# Altium footprint library CPD.PcbLib: 58 footprints (part 1 of 4)
Each footprint in its own frame and in the unit in brackets; x right, y up, seen from the top. Pads: shape width x height; smd on the part's side, far side on the other; paste and mask are expansions set on the pad; w line width, h text height; cw(c..) or ccw(c..) is an arc to the next point about the centre after c.
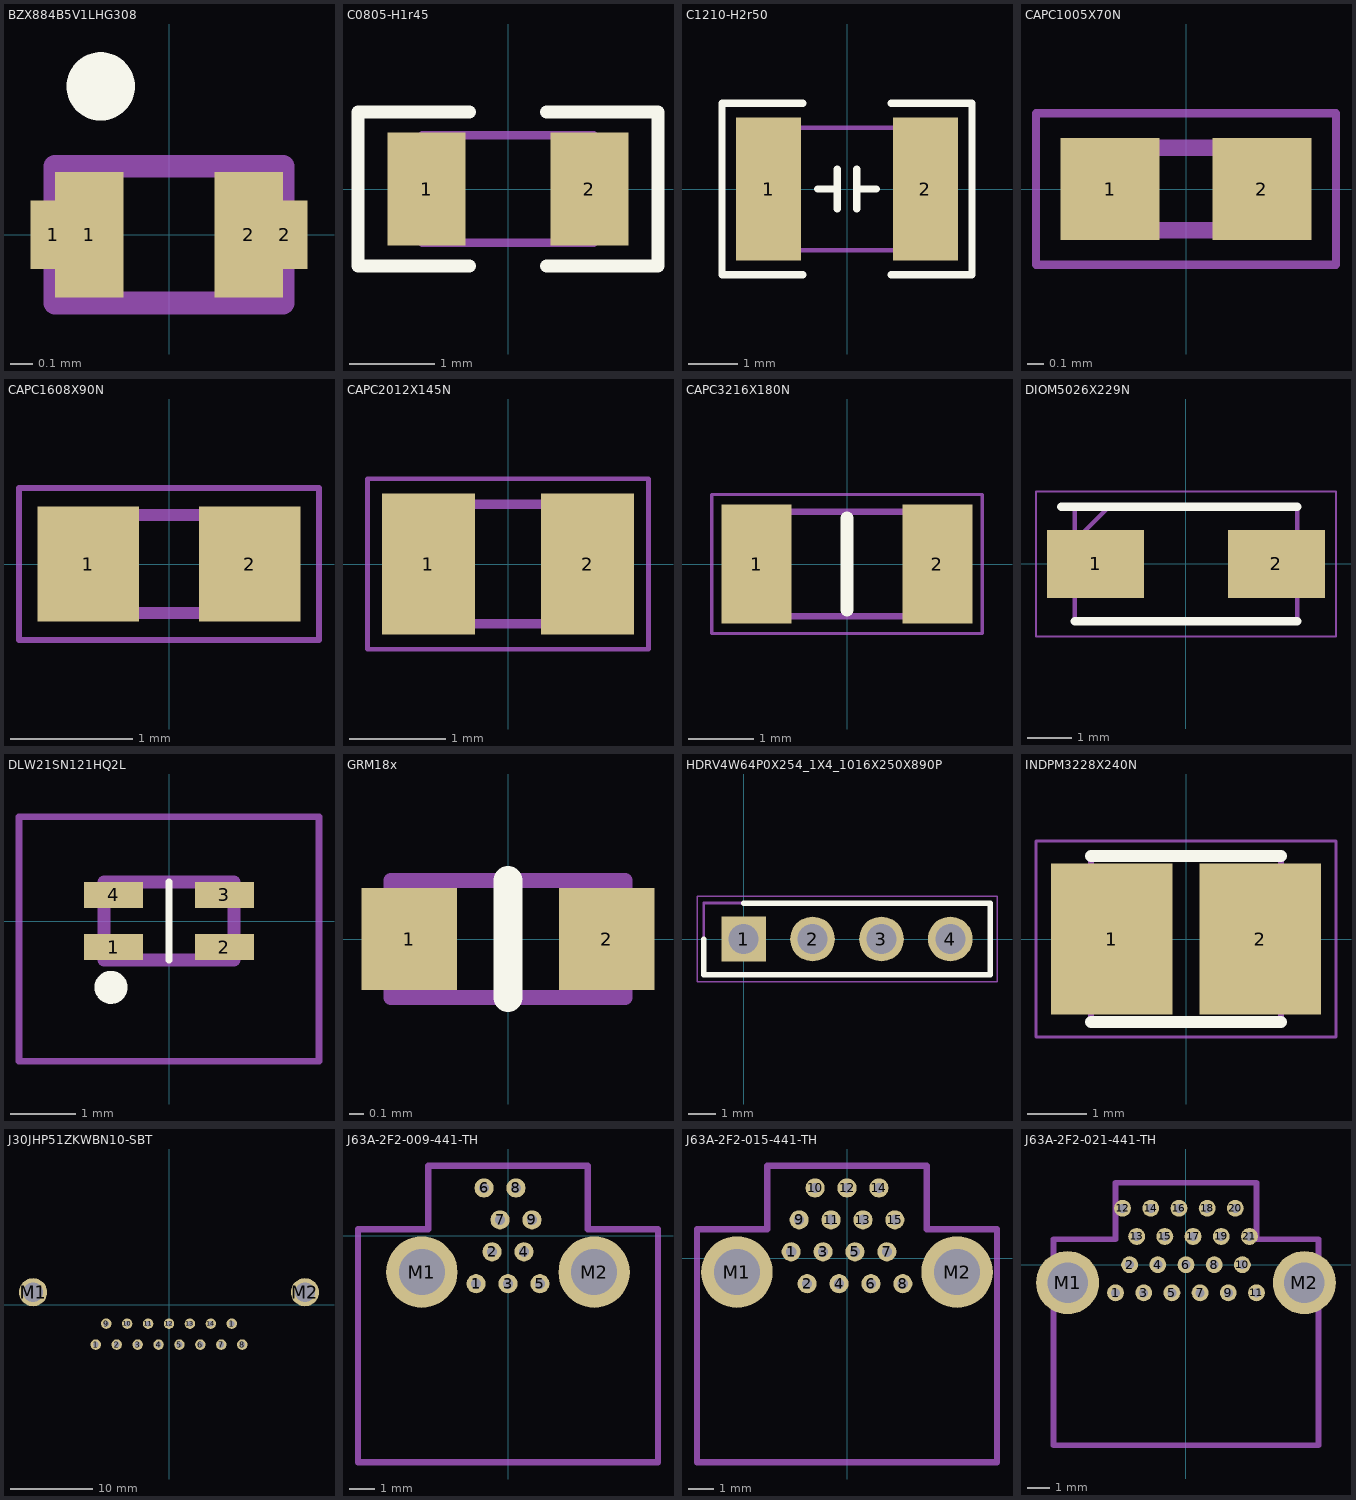
[diagram p0: the footprints below, top view; thin cyan lines are the x and y axes]

## BZX884B5V1LHG308 [mm]
pads (4):
  rect 0.2x0.3 smd: 1(-0.508,0) 2(0.508,0)
  rect 0.3x0.55 smd: 1(-0.35,0) 2(0.35,0)
Top Overlay:
  lines w0.2: -0.3,0.6 cw(c-0.3,0.65) -0.3,0.7 ; -0.3,0.6 ccw(c-0.3,0.65) -0.3,0.7 ; -0.3,0.6 cw(c-0.3,0.65) -0.3,0.7
Mechanical 13:
  lines w0.1: -0.5,-0.3 -0.5,0.3 0.5,0.3 0.5,-0.3 -0.5,-0.3
3D body "BZX884B5V1L-HG3-08.stp": height 0.6, standoff 0, extent -0.68,-0.3 0.68,0.3

## C0805-H1r45 [mm]
height 1.45
pads (2):
  rect 0.914x1.321 smd paste+0 mask+0.076: 1(-0.95,0) 2(0.95,0)
Top Overlay:
  lines w0.152: -0.45,-0.9 -1.75,-0.9 -1.75,0.9 -0.45,0.9 ; 0.45,-0.9 1.75,-0.9 1.75,0.9 0.45,0.9
Mechanical 13:
  lines w0.1: -1,-0.625 1,-0.625 1,0.625 -1,0.625 -1,-0.625
  text "C0805-H1r45" at -2.704,-2.235 h1
3D body "C0805-H1r45.step": height 1.45, standoff 0, extent -1,-0.625 1,0.625

## C1210-H2r50 [mm]
height 2.5
pads (2):
  rect 1.321x2.921 smd paste+0 mask+0.076: 1(-1.6,0) 2(1.6,0)
Top Overlay:
  lines w0.152: -0.9,-1.75 -2.55,-1.75 -2.55,1.75 -0.9,1.75 ; -0.6,0 -0.2,0 ; -0.2,-0.4 -0.2,0.4 ; 0.2,-0.4 0.2,0.4 ; 0.2,0 0.6,0 ; 0.9,-1.75 2.55,-1.75 2.55,1.75 0.9,1.75
Mechanical 13:
  lines w0.1: -1.6,-1.25 -1.6,1.25 1.6,1.25 1.6,-1.25 ; -1.55,-1.25 1.55,-1.25
3D body "C1210-H2r50.step": height 2.6, standoff 0, extent -1.6,-1.27 1.6,1.23

## CAPC1005X70N [mm]
pads (2):
  rect 0.6x0.62 smd: 1(-0.46,0) 2(0.46,0)
Mechanical 13:
  lines w0.1: -0.5,-0.25 0.5,-0.25 0.5,0.25 -0.5,0.25 -0.5,-0.25
Mechanical 15:
  lines w0.05: -0.91,-0.46 0.91,-0.46 0.91,0.46 -0.91,0.46 -0.91,-0.46
3D body "GRM155C71H683KE19D.stp": height 0.5, standoff 0, extent -0.5,-0.25 0.5,0.25

## CAPC1608X90N [mm]
pads (2):
  rect 0.83x0.94 smd: 1(-0.66,0) 2(0.66,0)
Mechanical 13:
  lines w0.1: -0.8,-0.4 -0.8,0.4 0.8,0.4 0.8,-0.4 -0.8,-0.4
Mechanical 15:
  lines w0.05: -1.225,-0.62 -1.225,0.62 1.225,0.62 1.225,-0.62 -1.225,-0.62
3D body "CC0603KRX7R9BB474.stp": height 0.9, standoff 0, extent -0.85,-0.45 0.85,0.45

## CAPC2012X145N [mm]
pads (2):
  rect 0.97x1.47 smd: 1(-0.83,0) 2(0.83,0)
Mechanical 13:
  lines w0.1: -1,-0.625 -1,0.625 1,0.625 1,-0.625 -1,-0.625
Mechanical 15:
  lines w0.05: -1.465,-0.89 -1.465,0.89 1.465,0.89 1.465,-0.89 -1.465,-0.89
3D body "GRM21BR72A103KA01L.stp": height 1.45, standoff 0, extent -1,-0.625 1,0.625

## CAPC3216X180N [mm]
pads (2):
  rect 1.07x1.82 smd: 1(-1.38,0) 2(1.38,0)
Top Overlay:
  lines w0.2: 0,-0.7 0,0.7
Mechanical 13:
  lines w0.1: -1.6,-0.8 -1.6,0.8 1.6,0.8 1.6,-0.8 -1.6,-0.8
Mechanical 15:
  lines w0.05: -2.065,-1.06 -2.065,1.06 2.065,1.06 2.065,-1.06 -2.065,-1.06
3D body "GRM31CR72A105KA01K.stp": height 1.8, standoff 0, extent -1.6,-0.8 1.6,0.8

## DIOM5026X229N [mm]
pads (2):
  rect 2.2x1.55 smd: 1(-2.05,0) 2(2.05,0)
Top Overlay:
  lines w0.2: -2.825,1.298 2.52,1.298 ; -2.52,-1.298 2.52,-1.298
Mechanical 13:
  lines w0.1: -2.52,0.522 -1.745,1.298 ; -2.52,-1.298 2.52,-1.298 2.52,1.298 -2.52,1.298 -2.52,-1.298
Mechanical 15:
  lines w0.05: -3.4,-1.645 3.4,-1.645 3.4,1.645 -3.4,1.645 -3.4,-1.645
3D body "SMAJ90A.stp": height 2.29, standoff 0, extent -2.52,-1.298 2.52,1.298

## DLW21SN121HQ2L [mm]
pads (4):
  rect 0.9x0.4 smd: 1(-0.85,-0.4) 2(0.85,-0.4) 3(0.85,0.4) 4(-0.85,0.4)
Top Overlay:
  circle w0.254: c-0.889,-1.016 r0.127
  lines w0.1: 0,-0.6 0,0.6 0,-0.6
Mechanical 13:
  lines w0.2: -1,-0.6 1,-0.6 1,0.6 -1,0.6 -1,-0.6
Mechanical 15:
  lines w0.1: -2.3,-2.15 2.3,-2.15 2.3,1.6 -2.3,1.6 -2.3,-2.15
3D body "DLW21SN900SQ2L.stp": height 1.4, standoff 0, extent -1,-0.6 1,0.6

## GRM18x [mm]
pads (2):
  rect 0.65x0.7 smd: 1(-0.675,0) 2(0.675,0)
Top Overlay:
  lines w0.2: 0,-0.4 0,0.4
Mechanical 13:
  lines w0.1: -0.8,-0.4 0.8,-0.4 0.8,0.4 -0.8,0.4 -0.8,-0.4
3D body "GRM188Z71A106KA73D.stp": height 0.8, standoff 0, extent -0.8,-0.45 0.8,0.45

## HDRV4W64P0X254_1X4_1016X250X890P [mm]
pads (4):
  rect 1.65x1.65 hole 1.1: 1(0,0)
  round 1.65 hole 1.1: 2(2.54,0) 3(5.08,0) 4(7.62,0)
Top Overlay:
  lines w0.2: -1.47,0 -1.47,-1.325 9.09,-1.325 9.09,1.325 0,1.325
Mechanical 13:
  lines w0.1: -1.47,-1.325 -1.47,1.325 9.09,1.325 9.09,-1.325 -1.47,-1.325
Mechanical 15:
  lines w0.05: -1.72,-1.575 -1.72,1.575 9.34,1.575 9.34,-1.575 -1.72,-1.575
3D body "PZ254V-11-04P.stp": height 8.9, standoff -3.25, extent -1.27,-1.25 8.89,1.25

## INDPM3228X240N [mm]
pads (2):
  rect 2.05x2.55 smd: 1(-1.25,0) 2(1.25,0)
Top Overlay:
  lines w0.2: -1.6,-1.4 1.6,-1.4 ; -1.6,1.4 1.6,1.4
Mechanical 13:
  lines w0.1: -1.6,-1.4 -1.6,1.4 1.6,1.4 1.6,-1.4 -1.6,-1.4
Mechanical 15:
  lines w0.05: -2.525,-1.65 -2.525,1.65 2.525,1.65 2.525,-1.65 -2.525,-1.65
3D body "ME3220-103KLB.stp": height 2.4, standoff 0, extent -1.6,-1.4 1.6,1.4

## J30JHP51ZKWBN10-SBT [mil]
pads (17):
  round 50 hole 27.6: 1(-350,-190) 1(300,-90) 2(-250,-190) 3(-150,-190) 4(-50,-190) 5(50,-190) 6(150,-190) 7(250,-190) 8(350,-190) 9(-300,-90) 10(-200,-90) 11(-100,-90) 12(0,-90) 13(100,-90) 14(200,-90)
  round 134.5 hole 94.5: M1(-649.61,60) M2(649.61,60)
3D body "J30JHP15ZKWBN10-SBT.x_t": height 390.16, standoff -133.46, extent -767,-270 768.44,470.16

## J63A-2F2-009-441-TH [mil]
pads (11):
  round 30 hole 16: 1(-50,-75) 2(-25,-25) 3(0,-75) 4(25,-25) 5(50,-75) 6(-37.5,75) 7(-12.5,25) 8(12.5,75) 9(37.5,25)
  round 112 hole 72: M1(-135.04,-56.9) M2(135.04,-56.9)
Mechanical 1:
Mechanical 15:
  lines w10: -125,110 -125,10 -235,10 -235,-355 235,-355 235,10 125,10 125,110 ; -122,110 122,110
3D body "J63A-2F2-009-441-TH.STEP": height 153.52, standoff -138.61, extent -189.56,-349.72 189.57,105

## J63A-2F2-015-441-TH [mil]
pads (17):
  round 30 hole 16: 1(-87.5,10) 2(-62.5,-40) 3(-37.5,10) 4(-12.5,-40) 5(12.5,10) 6(37.5,-40) 7(62.5,10) 8(87.5,-40) 9(-75,60) 10(-50,110) 11(-25,60) 12(0,110) 13(25,60) 14(50,110) 15(75,60)
  round 112 hole 72: M1(-172.44,-21.9) M2(172.44,-21.9)
Mechanical 1:
Mechanical 15:
  lines w10: -125,145 -125,45 -235,45 -235,-320 235,-320 235,45 125,45 125,145 ; -122,145 122,145
3D body "J63A-2F2-015-441-TH.STEP": height 142.57, standoff -149.55, extent -226.97,-315 226.97,139.72

## J63A-2F2-021-441-TH [mil]
pads (23):
  round 30 hole 16: 1(-125,-50) 2(-100,0) 3(-75,-50) 4(-50,0) 5(-25,-50) 6(0,0) 7(25,-50) 8(50,0) 9(75,-50) 10(100,0) 11(125,-50) 12(-112.5,100) 13(-87.5,50) 14(-62.5,100) 15(-37.5,50) 16(-12.5,100) 17(12.5,50) 18(37.5,100) 19(62.5,50) 20(87.5,100) 21(112.5,50)
  round 112 hole 72: M1(-210.04,-31.89) M2(210.04,-31.89)
Mechanical 1:
Mechanical 15:
  lines w10: -125,145 -125,45 -235,45 -235,-320 235,-320 235,45 125,45 125,145 ; -122,145 122,145
3D body "J63A-2F2-021-441-TH.STEP": height 154.78, standoff -137.42, extent -265,-322.36 264.13,132.36